# Altium footprint library Connectors.PCBLIB: 126 footprints (part 1 of 8)
Each footprint in its own frame and in the unit in brackets; x right, y up, seen from the top. Pads: shape width x height; smd on the part's side, far side on the other; paste and mask are expansions set on the pad; w line width, h text height; cw(c..) or ccw(c..) is an arc to the next point about the centre after c.
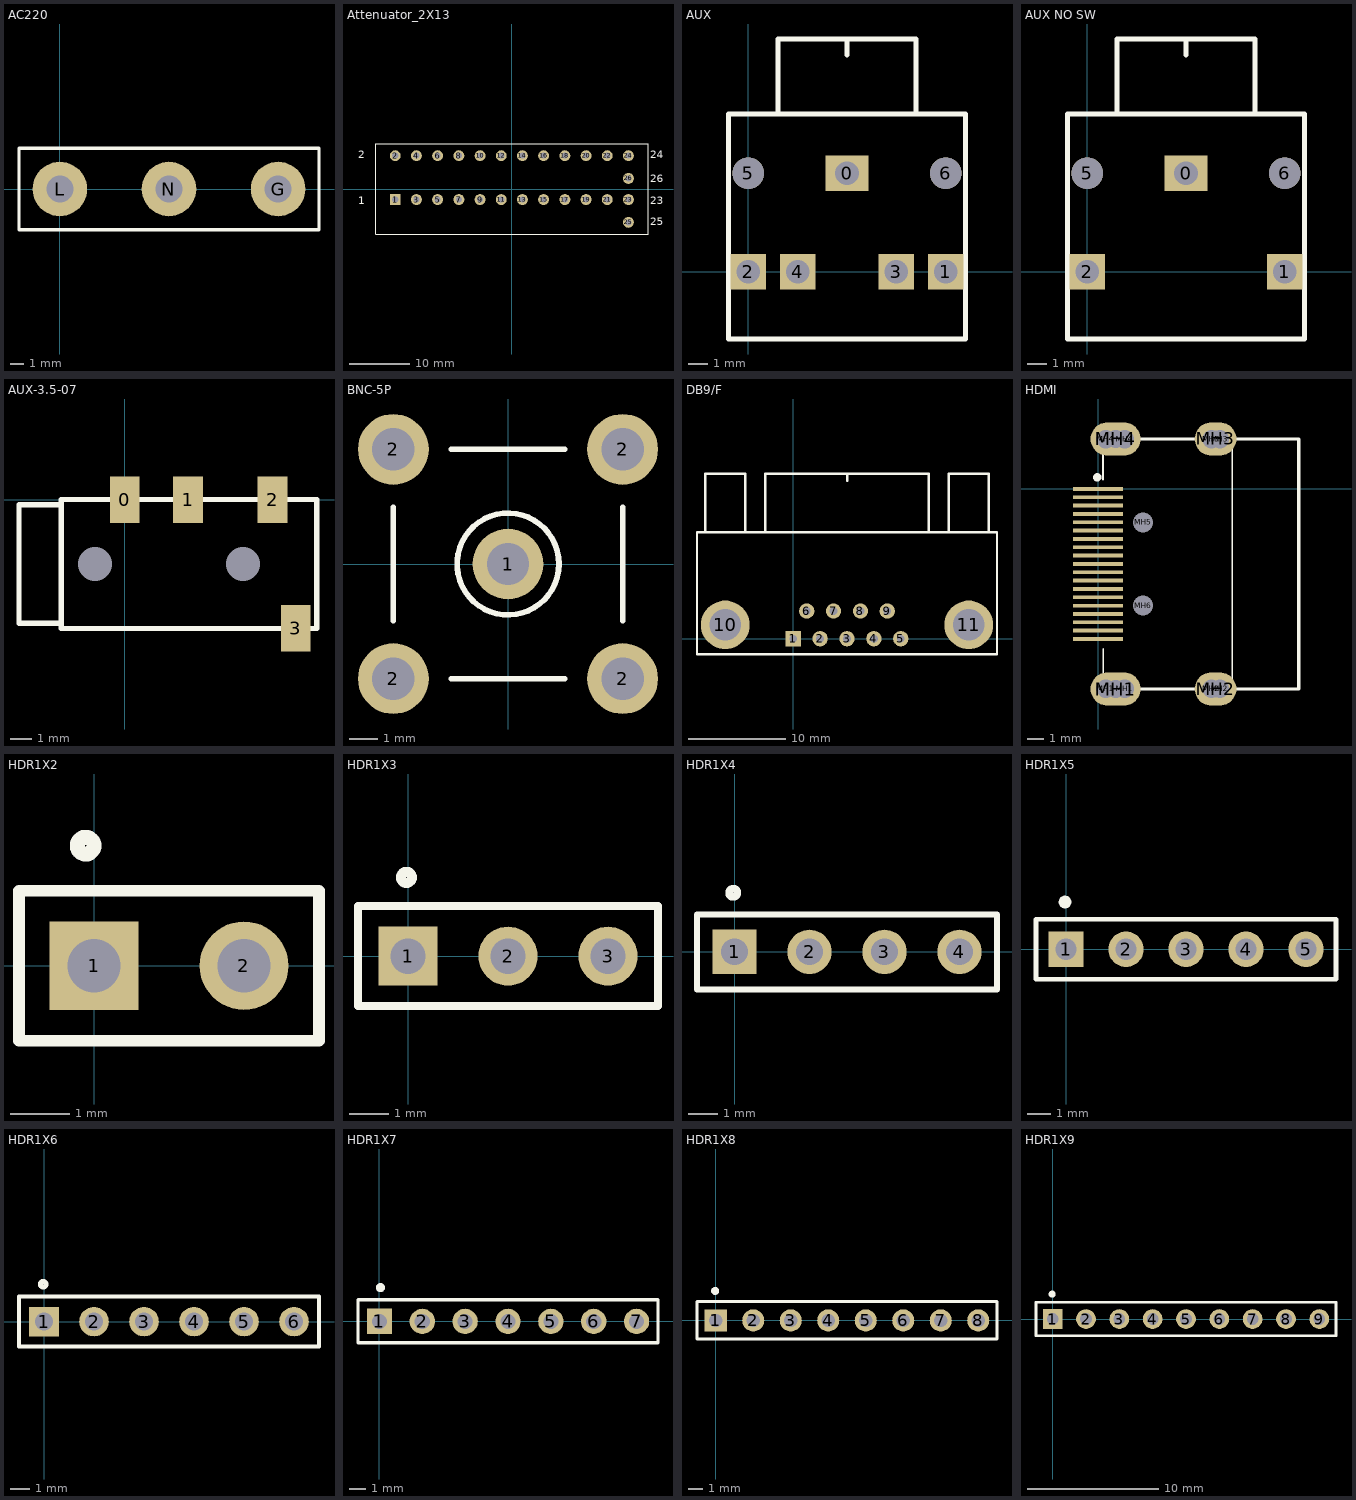
[diagram p0: the footprints below, top view; thin cyan lines are the x and y axes]

## AC220 [mm]
pads (3):
  round 4 hole 2: G(16,0) L(0,0) N(8,0)
Top Overlay:
  lines w0.254: -3,-3 -3,3 19,3 19,-3 -3,-3

## Attenuator_2X13 [mm] "Connector; Header; 13x2 Position"
pads (26):
  rect 1.8x1.8 hole 1: 1(-19.25,-1.75)
  round 1.8 hole 1: 2(-19.25,5.5) 3(-15.75,-1.75) 4(-15.75,5.5) 5(-12.25,-1.75) 6(-12.25,5.5) 7(-8.75,-1.75) 8(-8.75,5.5) 9(-5.25,-1.75) 10(-5.25,5.5) 11(-1.75,-1.75) 12(-1.75,5.5) 13(1.75,-1.75) 14(1.75,5.5) 15(5.25,-1.75) 16(5.25,5.5) 17(8.75,-1.75) 18(8.75,5.5) 19(12.25,-1.75) 20(12.25,5.5) 21(15.75,-1.75) 22(15.75,5.5) 23(19.25,-1.75) 24(19.25,5.5) 25(19.25,-5.5) 26(19.25,1.75)
Top Overlay:
  lines w0.2: -22.5,-7.5 -22.5,7.5 22.5,7.5 22.5,-7.5 -22.5,-7.5
  text "25" at 22.86,-6 h1.27
  text "26" at 22.86,1.1 h1.27
  text "1" at -25.4,-2.54 h1.27
  text "2" at -25.4,5.08 h1.27
  text "23" at 22.86,-2.54 h1.27
  text "24" at 22.86,5.08 h1.27

## AUX [mm]
pads (7):
  rect 2.2x1.8 hole 1.2: 0(5,5)
  rect 1.8x1.8 hole 1.2: 1(10,0) 2(0,0) 3(7.5,0) 4(2.5,0)
  round 1.6 hole 1.6 unplated: 5(0,5) 6(10,5)
Top Overlay:
  lines w0.254: 1.5,8 1.5,11.8 8.4,11.8 ; 5,11 5,11.8 ; 8.5,8 8.5,11.8 ; -1,-3.4 -1,8 11,8 11,-3.4 -1,-3.4
3D body "耳": height 3.2, standoff -10.8, extent -1.041,-3.689 11.059,11.411

## AUX NO SW [mm]
pads (5):
  rect 2.2x1.8 hole 1.2: 0(5,5)
  rect 1.8x1.8 hole 1.2: 1(10,0) 2(0,0)
  round 1.6 hole 1.6 unplated: 5(0,5) 6(10,5)
Top Overlay:
  lines w0.254: 1.5,8 1.5,11.8 8.4,11.8 ; 5,11 5,11.8 ; 8.5,8 8.5,11.8 ; -1,-3.4 11,-3.4 11,8 -1,8 -1,-3.4
3D body "耳": height 3.2, standoff -10.8, extent -1.041,-3.689 11.059,11.411

## AUX-3.5-07 [mm]
pads (6):
  rect 1.4x2.2 smd: 0(-0.012,0) 1(2.988,0) 2(6.988,0) 3(8.088,-6.1)
  round 1 hole 1.6: ""(-1.412,-3.05) ""(5.588,-3.05)
Top Overlay:
  lines w0.254: -3.012,-5.85 -3.012,-6.1 9.088,-6.1 9.088,0 -3.012,0 -3.012,-0.25 ; -3.012,-5.85 -3.012,-0.25 ; -3.012,-5.85 -5.012,-5.85 -5.012,-0.25 -3.012,-0.25
3D body "SW3dPS-audio_buchse.STEP": height 4.06, standoff -0.01, extent -4.178,-6.507 7.792,0.827

## BNC-5P [mm] "Connector; BNC"
pads (5):
  round 2.5 hole 1.5: 1(0,0) 2(-4.05,-4.05) 2(-4.05,4.05) 2(4.05,-4.05) 2(4.05,4.05)
Top Overlay:
  circle w0.2: c0,0 r1.8
  lines w0.2: -4.05,-2 -4.05,2 ; -2,-4.05 2,-4.05 ; -2,4.05 2,4.05 ; 4.05,-2 4.05,2
Mechanical 1:
  circle w0.025: c0,0 r1.8
  circle w0.025: c0,0 r1.05
  circle w0.025: c0,0 r0.2

## DB9/F [mm]
pads (11):
  rect 1.575x1.575 hole 0.8: 1(0,0)
  round 1.575 hole 0.8: 2(2.76,0) 3(5.52,0) 4(8.28,0) 5(11.04,0) 6(1.38,2.84) 7(4.14,2.84) 8(6.9,2.84) 9(9.66,2.84)
  round 5 hole 3.25: 10(-6.98,1.42) 11(18.02,1.42)
Top Overlay:
  lines w0.254: -9.05,10.92 -9.05,16.92 -4.94,16.92 ; -4.91,10.92 -4.91,16.92 ; -2.85,10.92 -2.85,16.92 13.9,16.92 13.9,10.92 ; 5.525,16.2 5.525,16.9 ; 15.95,10.92 15.95,16.92 20.06,16.92 ; 20.09,10.92 20.09,16.92 ; -9.88,-1.58 -9.88,10.92 20.92,10.92 20.92,-1.58 -9.88,-1.58
3D body "SW3dPS-9-PIN_DSUB-1.STEP": height 12.81, standoff -2.91, extent -9.925,-2.012 20.885,17.063

## HDMI [mm]
pads (33):
  rect 3x0.23 smd: 1(0,0) 2(0,-0.5) 3(0,-1) 4(0,-1.5) 5(0,-2) 6(0,-2.5) 7(0,-3) 8(0,-3.5) 9(0,-4) 10(0,-4.5) 11(0,-5) 12(0,-5.5) 13(0,-6) 14(0,-6.5) 15(0,-7) 16(0,-7.5) 17(0,-8) 18(0,-8.5) 19(0,-9)
  round 1.1 hole 1.1: MH1(0.454,-11.993) MH1(1.597,-11.993) MH2(6.804,-11.993) MH2(7.312,-11.993) MH3(6.804,2.993) MH3(7.312,2.993) MH4(0.454,2.993) MH4(1.597,2.993)
  oval 3x2 hole 1.1: MH1(1.05,-12) MH4(1.05,3)
  oval 2.5x2 hole 1: MH2(7.05,-12) MH3(7.05,3)
  round 1.1 hole 1.2: MH5(2.7,-2) MH6(2.7,-7)
Top Overlay:
  circle w0.25: c-0.05,0.7 r0.125
  lines w0.1: 0.3,-9.58 0.3,-12 7.55,-12 ; 0.3,0.573 0.3,2.993 ; 0.443,3 7.693,3 ; 8.05,-12 8.05,3 ; 12.05,-12 12.05,3
  lines w0.2: 2.4,-12 7.55,-12 ; 2.4,3 7.05,3 ; 7.439,-12 12.05,-12 12.05,3 8.201,3
Mechanical 1:
  lines w0.1: 0.55,-12.55 cw(c0.55,-12) 0.55,-11.45 1.55,-11.45 cw(c1.55,-12) 1.55,-12.55 0.55,-12.55 ; 0.55,2.45 cw(c0.55,3) 0.55,3.55 1.55,3.55 cw(c1.55,3) 1.55,2.45 0.55,2.45 ; 6.804,-12.55 cw(c6.804,-12) 6.804,-11.45 7.312,-11.45 cw(c7.312,-12) 7.312,-12.55 6.804,-12.55 ; 6.804,2.45 cw(c6.804,3) 6.804,3.55 7.312,3.55 cw(c7.312,3) 7.312,2.45 6.804,2.45
3D body "User Library-10029449-001LF.STEP": height 5.98, standoff -2.02, extent 0.151,-12.854 10.051,3.346

## HDR1X2 [mm] "Connector; Header; 2 Position"
pads (2):
  rect 1.5x1.5 hole 0.9: 1(0,0)
  round 1.5 hole 0.9: 2(2.54,0)
Top Overlay:
  circle w0.254: c-0.141,2.032 r0.141
  lines w0.2: -1.27,-1.27 -1.27,1.27 3.81,1.27 3.81,-1.27 -1.27,-1.27
3D body "1001-2.STEP": height 8.54, standoff -3, extent -1.27,-1.27 3.81,1.27

## HDR1X3 [mm] "Connector; Header; 3 Position"
pads (3):
  rect 1.5x1.5 hole 0.9: 1(0,0)
  round 1.5 hole 0.9: 2(2.54,0) 3(5.08,0)
Top Overlay:
  circle w0.254: c-0.041,2 r0.141
  lines w0.2: -1.27,-1.27 6.35,-1.27 6.35,1.27 -1.27,1.27 -1.27,-1.27
3D body "1001-3.STEP": height 8.54, standoff -3, extent -1.27,-1.27 6.35,1.27

## HDR1X4 [mm] "Connector; Header; 4 Position"
pads (4):
  rect 1.5x1.5 hole 0.9: 1(0,0)
  round 1.5 hole 0.9: 2(2.54,0) 3(5.08,0) 4(7.62,0)
Top Overlay:
  circle w0.254: c-0.041,2 r0.141
  lines w0.2: -1.27,-1.27 -1.27,1.27 8.89,1.27 8.89,-1.27 -1.27,-1.27
3D body "1001-4.STEP": height 8.54, standoff -3, extent -1.27,-1.27 8.89,1.27

## HDR1X5 [mm] "Connector; Header; 5 Position"
pads (5):
  rect 1.5x1.5 hole 0.9: 1(0,0)
  round 1.5 hole 0.9: 2(2.54,0) 3(5.08,0) 4(7.62,0) 5(10.16,0)
Top Overlay:
  circle w0.254: c-0.041,2 r0.141
  lines w0.2: -1.27,-1.27 11.43,-1.27 11.43,1.27 -1.27,1.27 -1.27,-1.27
3D body "1001-5.STEP": height 8.54, standoff -3, extent -1.27,-1.27 11.43,1.27

## HDR1X6 [mm] "Connector; Header; 6 Position"
pads (6):
  rect 1.5x1.5 hole 0.9: 1(0,0)
  round 1.5 hole 0.9: 2(2.54,0) 3(5.08,0) 4(7.62,0) 5(10.16,0) 6(12.7,0)
Top Overlay:
  circle w0.254: c-0.041,1.9 r0.141
  lines w0.2: -1.27,-1.27 -1.27,1.27 13.97,1.27 13.97,-1.27 -1.27,-1.27
3D body "1001-6.STEP": height 8.54, standoff -3, extent -1.27,-1.27 13.97,1.27

## HDR1X7 [mm] "Connector; Header; 7 Position"
pads (7):
  rect 1.5x1.5 hole 0.9: 1(0,0)
  round 1.5 hole 0.9: 2(2.54,0) 3(5.08,0) 4(7.62,0) 5(10.16,0) 6(12.7,0) 7(15.24,0)
Top Overlay:
  circle w0.254: c0.059,2 r0.141
  lines w0.2: -1.27,-1.27 -1.27,1.27 16.51,1.27 16.51,-1.27 -1.27,-1.27
3D body "1001-7.STEP": height 8.54, standoff -3, extent -1.27,-1.27 16.51,1.27

## HDR1X8 [mm] "Connector; Header; 8 Position"
pads (8):
  rect 1.5x1.5 hole 0.9: 1(0,0)
  round 1.5 hole 0.9: 2(2.54,0) 3(5.08,0) 4(7.62,0) 5(10.16,0) 6(12.7,0) 7(15.24,0) 8(17.78,0)
Top Overlay:
  circle w0.254: c-0.041,2 r0.141
  lines w0.2: -1.27,-1.27 19.05,-1.27 19.05,1.27 -1.27,1.27 -1.27,-1.27
3D body "1001-8.STEP": height 8.54, standoff -3, extent -1.27,-1.27 19.05,1.27

## HDR1X9 [mm] "Connector; Header; 9 Position"
pads (9):
  rect 1.5x1.5 hole 0.9: 1(0,0)
  round 1.5 hole 0.9: 2(2.54,0) 3(5.08,0) 4(7.62,0) 5(10.16,0) 6(12.7,0) 7(15.24,0) 8(17.78,0) 9(20.32,0)
Top Overlay:
  circle w0.254: c-0.041,1.9 r0.141
  lines w0.2: -1.27,-1.27 -1.27,1.27 21.59,1.27 21.59,-1.27 -1.27,-1.27
3D body "HDR1x9.STEP": height 8.54, standoff -3, extent -1.27,-1.27 21.59,1.27